# Altium schematic symbol library AD_Lib.SchLib: 1239 symbols (part 2 of 9)
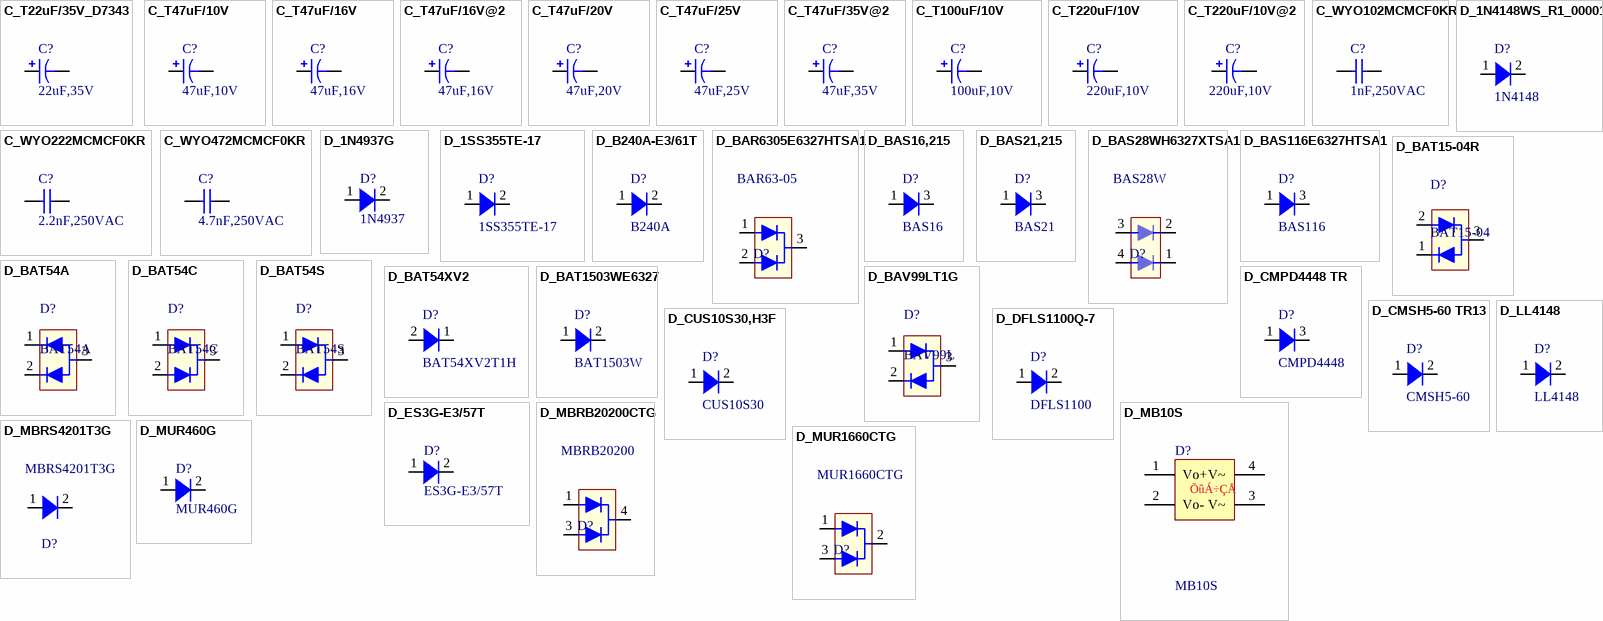
[diagram p43: symbols C_T22uF/35V_D7343 to D_MUR1660CTG]

## D_LL4148
designator D?, comment LL4148
¶þ¼«¹Ü,²£·â; Manufacturer: Fairchild; pro-environment: RoHS; Quality: -65~175¡æ; SN: 03.4.21.11.99414801S; Value: 0.2A,100V; other: Trr=4ns; PadsNum: 0; Category: ¶þ¼«¹Ü; OPN: LL4148; Part: LL4148; QTY: 2500; Price: 0.117; OPN_JLC: OPN_JLC; SN_JLC: SN_JLC; Price_JLC: 0
footprint SOD80 (Metal Electrode Face (MELF) Diode; Body 3.5 x 1.6 mm (LxDia))
pins: 1 A, 2 K

## D_MB10S
designator D?, comment MB10S
ÕûÁ÷ÇÅ;0.5A/1000V; Manufacturer: ON; Quality: -40~150¡æ; Value: 5V/0.2A; pro-environment: RoHS; PadsNum: 0; SN: SN; other: 0.5A/1000V; Category: Ä£¿éµçÂ·; OPN: MB10S; Part: MB10S; QTY: 3000; Price: 1.3688; OPN_JLC: OPN_JLC; SN_JLC: SN_JLC; Price_JLC: 0
footprint SOIC245P670X290-4N (SOIC-4, ÈçMB107S)
pins: 1 Vo+ (power), 2 Vo- (power), 3 V~ (power), 4 V~ (power)
text: ÕûÁ÷ÇÅ

## D_MBRB20200CTG
designator D?, comment MBRB20200
Ð¤ÌØ»ù¶þ¼«¹Ü; 20A; 200V; 1V; Manufacturer: ON; Quality: -65~150¡æ; Value: 20A,200V; pro-environment: RoHS; OPN: MBRB20200CTG; PadsNum: 0; SN: SN; Category: ¶þ¼«¹Ü; Part: MBRB20200; QTY: 50; Price: 9.9333; OPN_JLC: OPN_JLC; SN_JLC: C897026; Price_JLC: 0
footprint TO263-3 (D2-PAK, 4-Leads, Body 9.3x10.2mm, Pitch 2.54mm, Lead Span 15.2mm, IPC Low Density)
pins: 1, 3, 4

## D_MBRS4201T3G
designator D?, comment MBRS4201T3G
Ð¤ÌØ»ù¶þ¼«¹Ü; 4A; 200V; 0.8V; 35ns; Manufacturer: ON; Quality: -55~150¡æ; Value: 4A,200V; pro-environment: RoHS; other: Vf=0.8V;trr=35ns; PadsNum: 2; SN: SN; Category: ¶þ¼«¹Ü; OPN: MBRS4201T3G; Part: MBRS4201T3G; QTY: 2500; Price: 3.5802; OPN_JLC: OPN_JLC; SN_JLC: C145187; Price_JLC: 2.61
footprint SMC (DO-214-AB/SMC)
pins: 1 A, 2 K

## D_MUR460G
designator D?, comment MUR460G
¿ì»Ö¶þ¼«¹Ü;4A;600V; Manufacturer: ON; pro-environment: RoHS; Quality: -55~150¡æ; SN: 03.4.21.11.99460G01S; Value: 4A,600V; other: Vf=1.28V;trr=75ns; PadsNum: 0; Category: ¶þ¼«¹Ü; OPN: MUR460G; Part: MUR460G; QTY: 500; Price: 2.1294; OPN_JLC: OPN_JLC; SN_JLC: SN_JLC; Price_JLC: 0
footprint DO-201AD (Diode, Axial; Body 9.5 x 5.3 mm (LxDia. max), Lead Dia. 1.32 mm (max))
pins: 1 A, 2 K

## D_MUR1660CTG
designator D?, comment MUR1660CTG
¶þ¼«¹Ü; ³¬¿ì»Ö; 16A; 600V; Manufacturer: ON; Quality: -65~175¡æ; Value: 16A,600V; pro-environment: RoHS; SN: 03.4.21.11.31166001S; other: 16A;600V;60ns; PadsNum: 0; Category: ¶þ¼«¹Ü; OPN: MUR1660CTG; Part: MUR1660CTG; QTY: 50; Price: 6.5169; OPN_JLC: OPN_JLC; SN_JLC: SN_JLC; Price_JLC: 0
footprint TO220-3 (TO, Thru-Hole, Vertical, Heatsink Mounted; 3 In-Line Leads; Pitch 2.54 mm)
pins: 1, 2, 3

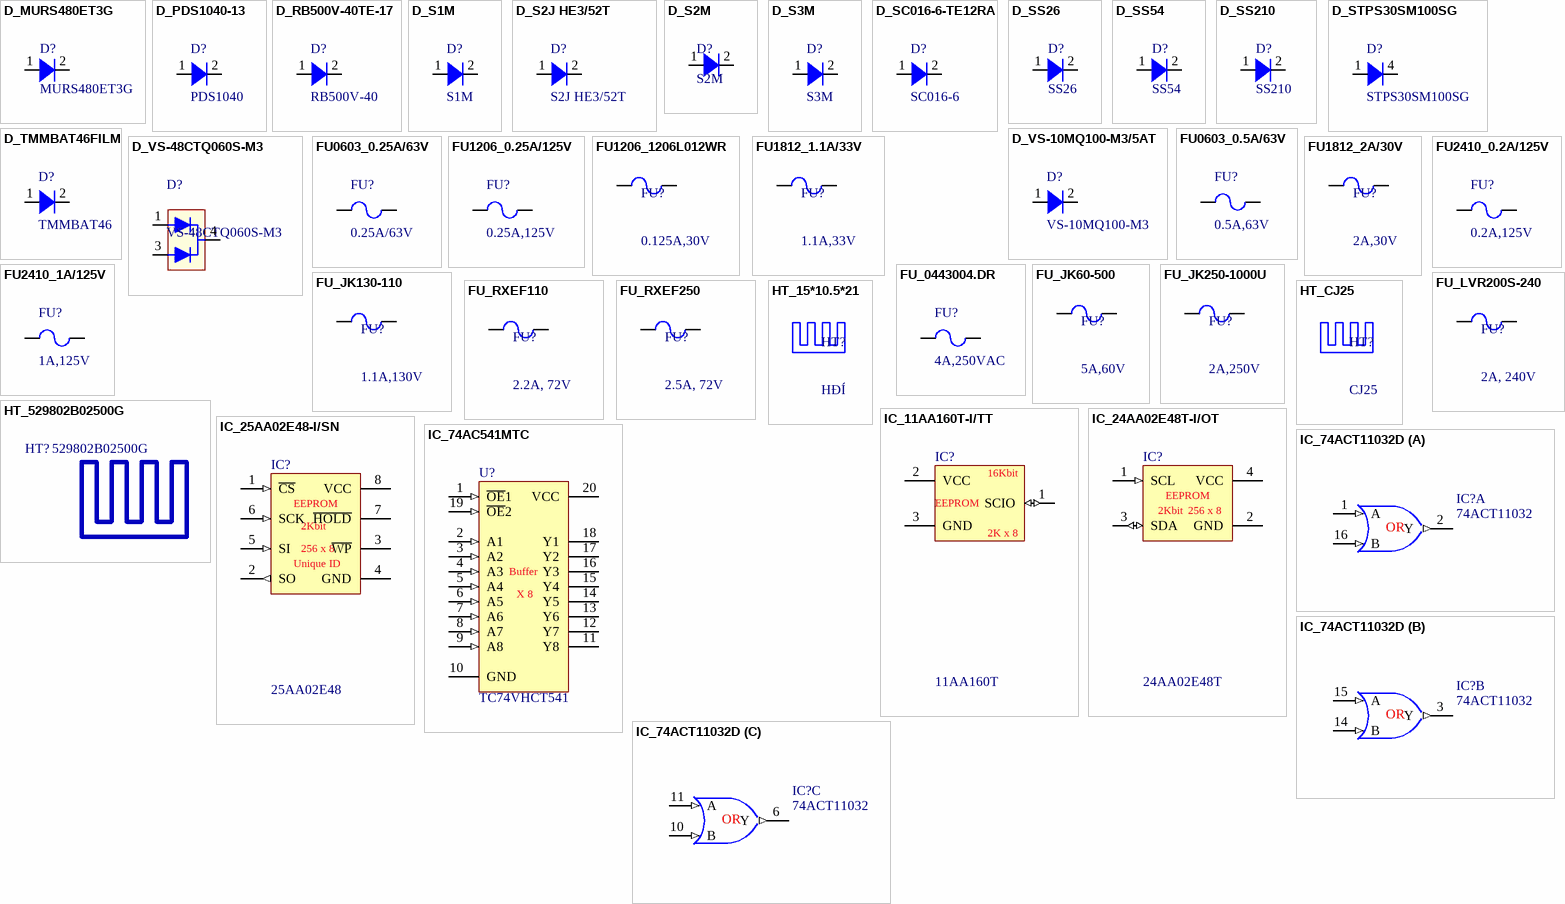
[diagram p5: symbols D_MURS480ET3G to IC_74ACT11032D]

## D_MURS480ET3G
designator D?, comment MURS480ET3G
Ð¤ÌØ»ù¶þ¼«¹Ü; 4A; 800V; .185V; 100ns; Manufacturer: ON; pro-environment: RoHS; Quality: -65~175¡æ; Value: 4A,800V; PadsNum: 2; SN: SN; Category: ¶þ¼«¹Ü; OPN: MURS480ET3G; Part: MURS480ET3G; QTY: 2500; Price: ?; OPN_JLC: MURS480ET3G; SN_JLC: C145513; Price_JLC: 4.72
footprint SMC (DO-214-AB/SMC)
pins: 1 A, 2 K

## D_PDS1040-13
designator D?, comment PDS1040
Ð¤ÌØ»ù¶þ¼«¹Ü;10A;40V; Manufacturer: Diodes; pro-environment: RoHS; Quality: -65~180¡æ; SN: 03.4.21.17.99PDS101S; Value: 10A,40V; OPN: PDS1040-13; other: MARK=S1040; PadsNum: 0; Category: ¶þ¼«¹Ü; Part: PDS1040; QTY: 5000; Price: 1.11618; Price: 3.4983; OPN_JLC: OPN_JLC; SN_JLC: SN_JLC; Price_JLC: 0
footprint POWERDI_5 (DIODEÖ®Ð¤ÍÑ»ù¶þ¼«¹Ü)
pins: 1 A, 2 K

## D_RB500V-40TE-17
designator D?, comment RB500V-40
Ð¤ÌØ»ù¶þ¼«¹Ü;0.1A;45V; Manufacturer: ROHM; pro-environment: RoHS; Quality: -55~150¡æ; Value: 0.1A,45V; OPN: RB500V-40TE-17; PadsNum: 0; SN: SN; Category: ¶þ¼«¹Ü; Part: RB500V-40; Price: ?; OPN_JLC: OPN_JLC; SN_JLC: SN_JLC; Price_JLC: 0
footprint SOD323 (SOD-323/SC-76; 2 Leads; Body 1.7 x 1.3 mm, (LxW))
pins: 1 A, 2 K

## D_S1M
designator D?, comment S1M
ÕûÁ÷¶þ¼«¹Ü;1A;1kV; Manufacturer: Fairchild; pro-environment: RoHS; Quality: -55~150¡æ; SN: 03.4.21.11.990S1M01S; Value: 1A,1000V; PadsNum: 0; Category: ¶þ¼«¹Ü; OPN: S1M; Part: S1M; QTY: 7500; Price: 0.3074; OPN_JLC: US1M; SN_JLC: C5441; Price_JLC: 0
footprint SMA (DO-214-AC/SMA)
pins: 1 A, 2 K

## D_S2J HE3/52T
designator D?, comment S2J HE3/52T
ÕûÁ÷¶þ¼«¹Ü;1.5A;600V; Manufacturer: Vishay; pro-environment: RoHS; Quality: -55~150¡æ; SN: 03.4.21.11.99S2JH01S; Value: 1.5A,600V; PadsNum: 0; Category: ¶þ¼«¹Ü; OPN: S2J HE3/52T; Part: S2J HE3/52T; QTY: 750; Price: ?; OPN_JLC: OPN_JLC; SN_JLC: SN_JLC; Price_JLC: 0
footprint SMB (DO-214-AA/SMB)
pins: 1 A, 2 K

## D_S2M
designator D?, comment S2M
ÕûÁ÷¶þ¼«¹Ü; 1.1V@2A; 1kV; Manufacturer: ON; pro-environment: RoHS; Quality: -65~150¡æ; Value: 2A,1kV; PadsNum: 2; Category: ¶þ¼«¹Ü; OPN: S2M; Part: S2M; QTY: 3000; SN: SN; Price: 0.6084; OPN_JLC: S2M; SN_JLC: C18905; Price_JLC: 0.118141
footprint SMB (DO-214-AA/SMB)
pins: 1 A, 2 K

## D_S3M
designator D?, comment S3M
ÕûÁ÷¶þ¼«¹Ü;3A;1kV; Manufacturer: Fairchild; pro-environment: RoHS; Quality: -55~150¡æ; SN: 03.4.21.11.990S3M01S; Value: 3A,1000V; PadsNum: 0; Category: ¶þ¼«¹Ü; OPN: S3M; Part: S3M; QTY: 3000; Price: 0.80847; OPN_JLC: OPN_JLC; SN_JLC: SN_JLC; Price_JLC: 0
footprint SMC (DO-214-AB/SMC)
pins: 1 A, 2 K

## D_SC016-6-TE12RA
designator D?, comment SC016-6
ÕûÁ÷¶þ¼«¹Ü;1A;600V; Manufacturer: Vishay; pro-environment: RoHS; Quality: -55~150¡æ; Value: 1A,600V; OPN: SC016-6-TE12RA; other: MARK=B6; PadsNum: 0; SN: SN; Category: ¶þ¼«¹Ü; Part: SC016-6; QTY: 750; Price: ?; OPN_JLC: OPN_JLC; SN_JLC: SN_JLC; Price_JLC: 0
footprint SMB (DO-214-AA/SMB)
pins: 1 A, 2 K

## D_SS26
designator D?, comment SS26
Ð¤ÌØ»ù¶þ¼«¹Ü; 2A; 60V; 0.7V@2A; Manufacturer: Fairchild; pro-environment: RoHS; Quality: -65~125¡æ; SN: 03.4.21.17.99SS2601S; Value: 2A,60V; PadsNum: 0; Category: ¶þ¼«¹Ü; OPN: SS26; Part: SS26; QTY: 3000; Price: 1.02726; OPN_JLC: OPN_JLC; SN_JLC: SN_JLC; Price_JLC: 0
footprint SMB (DO-214-AA/SMB)
pins: 1 A, 2 K

## D_SS54
designator D?, comment SS54
Ð¤ÌØ»ù¶þ¼«¹Ü;5A;40V; Manufacturer: LC Á¢´´; pro-environment: RoHS; Quality: -65~125¡æ; Value: 5A,40V; PadsNum: 0; SN: SN; Category: ¶þ¼«¹Ü; OPN: SS54; Part: SS54; QTY: 3000; Price: 0.304; OPN_JLC: SS54; SN_JLC: C22452; Price_JLC: 0
footprint SMA (DO-214-AC/SMA)
pins: 1 A, 2 K

## D_SS210
designator D?, comment SS210
Ð¤ÌØ»ù¶þ¼«¹Ü;2A;100V; Manufacturer: LC Á¢´´; pro-environment: RoHS; Quality: -65~125¡æ; Value: 2A,100V; PadsNum: 0; SN: SN; Category: ¶þ¼«¹Ü; OPN: SS210; Part: SS210; QTY: 3000; Price: 0.18; OPN_JLC: SS210; SN_JLC: C14996; Price_JLC: 0
footprint SMA (DO-214-AC/SMA)
pins: 1 A, 2 K

## D_STPS30SM100SG
designator D?, comment STPS30SM100SG
Ð¤ÌØ»ù¶þ¼«¹Ü;30A;100V; Manufacturer: ST; pro-environment: RoHS; Quality: -40~150¡æ; SN: 03.4.21.17.72S30S01S; Value: 30A,100V; PadsNum: 0; Category: ¶þ¼«¹Ü; OPN: STPS30SM100SG; Part: STPS30SM100SG; QTY: 10000; other: 30A;100V; Price: 9.594; OPN_JLC: OPN_JLC; SN_JLC: SN_JLC; Price_JLC: 0
footprint TO263-3 (D2-PAK, 4-Leads, Body 9.3x10.2mm, Pitch 2.54mm, Lead Span 15.2mm, IPC Low Density)
pins: 1 A, 3 A, 4 K

## D_TMMBAT46FILM
designator D?, comment TMMBAT46
Ð¤ÌØ»ù¶þ¼«¹Ü;0.15A;100V; Manufacturer: ST; pro-environment: RoHS; Quality: -65~150¡æ; SN: 03.4.37.11.99D10701S; Value: 0.15A,100V; OPN: TMMBAT46FILM; PadsNum: 0; Category: ¶þ¼«¹Ü; Part: TMMBAT46; QTY: 2500; other: 0.15A,100V; Price: 0.94302; OPN_JLC: OPN_JLC; SN_JLC: SN_JLC; Price_JLC: 0
footprint Mini MELF (Footprint not found)
pins: 1 A, 2 K

## D_VS-10MQ100-M3/5AT
designator D?, comment VS-10MQ100-M3
Ð¤ÌØ»ù¶þ¼«¹Ü;1A;100V; 0.78V@1A; Manufacturer: Vishay; pro-environment: RoHS; Quality: -55~170¡æ; SN: 03.4.21.17.9910MQ01S; Value: 1A,100V; OPN: VS-10MQ100-M3/5AT; other: MARK=F09; PadsNum: 0; Category: ¶þ¼«¹Ü; Part: VS-10MQ100-M3; QTY: 7500; Price: 0.60021; OPN_JLC: OPN_JLC; SN_JLC: SN_JLC; Price_JLC: 0
footprint SMA (DO-214-AC/SMA)
pins: 1 A, 2 K

## D_VS-48CTQ060S-M3
designator D?, comment VS-48CTQ060S-M3
Ð¤ÌØ»ù¶þ¼«¹Ü;40A;60V; Manufacturer: Vishay; pro-environment: RoHS; Quality: -55~150¡æ; SN: 03.4.21.14.5148CT02S; Value: 40A,60V; PadsNum: 0; Category: ¶þ¼«¹Ü; OPN: VS-48CTQ060S-M3; Part: VS-48CTQ060S-M3; QTY: 50; other: 40A,60V; Price: 14.2623; OPN_JLC: OPN_JLC; SN_JLC: SN_JLC; Price_JLC: 0
footprint TO263-3 (D2-PAK, 4-Leads, Body 9.3x10.2mm, Pitch 2.54mm, Lead Span 15.2mm, IPC Low Density)
pins: 1, 3, 4

## FU0603_0.5A/63V
designator FU?, comment 0.5A,63V
Ò»´ÎÐÔ; 0.5A/63V; Manufacturer: Littelfuse; pro-environment: RoHS; Quality: -55~150¡æ; OPN: 0438.500WR; other: MARK=F; PadsNum: 2; SN: SN; Value: 0.5A,63V; Category: ±£ÏÕË¿; Part: 0.5A; QTY: 3000; Price: ?; OPN_JLC: 0438.500WR; SN_JLC: C151114; Price_JLC: 0.283191
footprint FU0603 (ÌùÆ¬ÈÛË¿)
pins: 1, 2

## FU0603_0.25A/63V
designator FU?, comment 0.25A/63V
Ò»´ÎÐÔ; 0.25A/63V; Manufacturer: Littelfuse; Part: 0.25A; pro-environment: RoHS; Quality: -55~150¡æ; OPN: 0438.250WR; other: MARK=D; PadsNum: 2; SN: SN; Value: 0.25A/63V; Category: ±£ÏÕË¿; QTY: 3000; Price: ?; OPN_JLC: 0438.250WR; SN_JLC: C189641; Price_JLC: 0.43085
footprint FU0603 (ÌùÆ¬ÈÛË¿)
pins: 1, 2

## FU1206_0.25A/125V
designator FU?, comment 0.25A,125V
Ò»´ÎÐÔ; 0.25A/125V; Manufacturer: Littelfuse; pro-environment: RoHS; Quality: -55~150¡æ; OPN: 0437.250WR; other: MARK=D; PadsNum: 2; SN: SN; Value: 0.25A,125V; Category: ±£ÏÕË¿; Part: 0.25A; QTY: 3000; Price: ?; OPN_JLC: OPN_JLC; SN_JLC: C206951; Price_JLC: 0.698128
footprint FU1206 (¹«ÖÆ3216£»Ó¢ÖÆ1206£»)
pins: 1, 2

## FU1206_1206L012WR
designator FU?, comment 0.125A,30V
×Ô»Ö¸´; 0.125A/30V; 0.29A/200ms; Manufacturer: Littelfuse; Other: 0.125A;30V;0.29A;200ms; Quality: -40¡æ~85¡æ; pro-environment: RoHS; OPN: 1206L012WR; PadsNum: 2; Value: 0.125A,30V; SN: SN; QTY: 3000; part: 1206L012WR; Price: 1.5933; OPN_JLC: 1206L012WR; SN_JLC: C151160; Price_JLC: 0.458098; Category: ÈÛË¿
footprint FU1206 (¹«ÖÆ3216£»Ó¢ÖÆ1206£»)
pins: 1, 2

## FU1812_1.1A/33V
designator FU?, comment 1.1A,33V
×Ô»Ö¸´; 1.1A/33V; 2.2A/300ms; Manufacturer: ½ð¿Æ; part: 2.2A; Other: 1.1A; 33V; 2.2A; 300ms; Quality: -40¡æ~85¡æ; pro-environment: RoHS; PadsNum: 2; Value: 1.1A,33V; SN: SN; QTY: 2000; OPN: -; Price: -; OPN_JLC: JK-mSMD110-33; SN_JLC: C369173; Price_JLC: 0.448346; Category: ÈÛË¿
footprint FU1812 (¹«ÖÆ4832£»Ó¢ÖÆ1812£»¹¦ÂÊ1/2W)
pins: 1, 2

## FU1812_2A/30V
designator FU?, comment 2A,30V
×Ô»Ö¸´; 2A/30V; 4A/2s; Manufacturer: °Ûºê; part: 2.2A; Other: 2A; 30V; 4A; 2s; Quality: -40¡æ~85¡æ; pro-environment: RoHS; PadsNum: 2; Value: 2A,30V; SN: SN; QTY: 1500; OPN: -; Price: -; OPN_JLC: BSMD1812-200-30V; SN_JLC: C960026; Price_JLC: 0.448346; Category: ÈÛË¿
footprint FU1812 (¹«ÖÆ4832£»Ó¢ÖÆ1812£»¹¦ÂÊ1/2W)
pins: 1, 2

## FU2410_0.2A/125V
designator FU?, comment 0.2A,125V
Ò»´ÎÐÔ; 0.2A/125V; Manufacturer: Littelfuse; pro-environment: RoHS; Quality: -55~125¡æ; OPN: 0448.200MR; PadsNum: 2; SN: SN; Value: 0.2A,125V; Category: ±£ÏÕË¿; Part: 0.2A; QTY: 1000; Price: ?; OPN_JLC: OPN_JLC; SN_JLC: SN_JLC; Price_JLC: 0
footprint FU2410 (LittleFuse, 0448 series)
pins: 1, 2

## FU2410_1A/125V
designator FU?, comment 1A,125V
Ò»´ÎÐÔ; 1A/125V; Manufacturer: Littelfuse; pro-environment: RoHS; Quality: -55~125¡æ; SN: 03.4.39.11.99045201S; OPN: 0452001.MRL; PadsNum: 0; Value: 1A,125V; Category: ±£ÏÕË¿; Part: 0452001.MRL; QTY: 1000; Price: ?; OPN_JLC: OPN_JLC; SN_JLC: SN_JLC; Price_JLC: 0
footprint FU2410 (LittleFuse, 0448 series)
pins: 1, 2

## FU_0443004.DR
designator FU?, comment 4A,250VAC
Ò»´ÎÐÔ; 4A/250VAC, 16m¦¸; Manufacturer: Littelfuse; pro-environment: RoHS; Quality: -55~125¡æ; OPN: 0443004.DR; PadsNum: 2; SN: SN; Value: 4A,250VAC; Category: ÈÛË¿; Part: 0443004.DR; QTY: 1500; Price: ?; OPN_JLC: OPN_JLC; SN_JLC: C187540; Price_JLC: 2.9
footprint FU_443 (LittleFuse, 443 series)
pins: 1, 2

## FU_JK60-500
designator FU?, comment 5A,60V
×Ô»Ö¸´; 5A/60V; 10A; Manufacturer: ½ð¿Æ; part: JK60-500; Quality: -40¡æ~85¡æ; pro-environment: RoHS; PadsNum: 0; Other: 5A/60V; 10A; Value: 5A,60V; SN: SN; QTY: 200; OPN: -; Price: -; OPN_JLC: JK60-500; SN_JLC: C369097; Price_JLC: 0.8112; Category: ÈÛË¿
footprint FU_JK60-500 (Footprint not found)
pins: 1, 2

## FU_JK130-110
designator FU?, comment 1.1A,130V
×Ô»Ö¸´; 1.1A/130V; 2.2A; Manufacturer: ½ð¿Æ; part: JK130-110; Quality: -40¡æ~85¡æ; pro-environment: RoHS; SN: 03.4.38.14.99F11001S; PadsNum: 0; Other: 1.1A/130V; 2.2A; Value: 1.1A,130V; QTY: 500; OPN: -; Price: -; OPN_JLC: JK130-110; SN_JLC: C968442; Price_JLC: 0.460559; Category: ÈÛË¿
footprint FU_JK130-110 (½ð¿ÆÖ®PPTC£¬JK130-110)
pins: 1, 2

## FU_JK250-1000U
designator FU?, comment 2A,250V
×Ô»Ö¸´; 1A/250V; 2A; Manufacturer: ½ð¿Æ; part: JK250-1000U; Other: 1A/2A, 250V; Quality: -40¡æ~85¡æ; pro-environment: RoHS; PadsNum: 0; Value: 2A,250V; SN: SN; QTY: 500; OPN: -; Price: -; OPN_JLC: JK250-1000U; SN_JLC: C369137; Price_JLC: 1.1765; Category: ÈÛË¿
footprint FU_JK250-1000U (½ð¿ÆJK250ÏµÁÐÖ®PTC£¬JK250-1000U)
pins: 1, 2

## FU_LVR200S-240
designator FU?, comment 2A, 240V
×Ô»Ö¸´; 2A/240V; 4A; Manufacturer: Littelfuse; part: LVR200S; Other: 2A;240V;10%;; Quality: -30¡æ~85¡æ; pro-environment: RoHS; SN: 03.4.39.11.99R20001S; OPN: LVR200S-240; PadsNum: 2; Value: 2A, 240V; QTY: 250; Price: -; OPN_JLC: OPN_JLC; SN_JLC: C1562345; Price_JLC: 7.5; Category: ÈÛË¿
footprint FU_LVR-L5 (TEÖ®LVRÏµÁÐPPTC)
pins: 1, 2

## FU_RXEF110
designator FU?, comment 2.2A, 72V
×Ô»Ö¸´; 1.1A/72V, 2.2A; Manufacturer: Murata; Other: 2.2A;72V;10%; Quality: -40¡æ~85¡æ; pro-environment: RoHS; SN: 03.4.38.14.99F11001S; OPN: RXEF110; PadsNum: 0; Value: 2.2A, 72V; QTY: 500; part: RXEF110; Price: -; OPN_JLC: C434722; SN_JLC: SN_JLC; Price_JLC: 0.9922; Category: ÈÛË¿
footprint RXEF110 (LittelFuseÖ®PTC£¬RXEF110)
pins: 1, 2

## FU_RXEF250
designator FU?, comment 2.5A, 72V
×Ô»Ö¸´; 2.5A/72V; 5A; Manufacturer: Littelfuse; Quality: -40¡æ~85¡æ; pro-environment: RoHS; SN: 03.4.38.14.99F11001S; OPN: RXEF250; PadsNum: 2; Other: 2.5A/72V; 5A; Value: 2.5A, 72V; QTY: 250; part: RXEF250; Price: 3.616; OPN_JLC: RF2691-000; SN_JLC: C207232; Price_JLC: 3.75; Category: ÈÛË¿
footprint FU_RXEF250 (LittelFuseÖ®PPTC£¬RXEF250)
pins: 1, 2

## HT_15*10.5*21
designator HT?, comment HÐÍ
É¢ÈÈÆ¬; HÐÍ; 15*10.5*21; Manufacturer: öÎË³´ï; Value: 15*10.5*21 HÐÍÉ¢ÈÈÆ¬; pro-environment: RoHS; PadsNum: 0; Quality: *; SN: SN; QTY: *; Part: HÐÍ; other: *; Price: *; OPN_JLC: 15*10.5*21 HÐÍ; SN_JLC: C4649; Price_JLC: 0.578535
footprint HT_15x10.5x21 (Footprint not found)
pins: 1 P1 hidden, 2 P2 hidden

## HT_529802B02500G
designator HT?, comment 529802B02500G
É¢ÈÈÆ¬,3.7; Manufacturer: Aavid Thermalloy; Value: ¦Èn=3.70; SN: 03.4.39.18.99529801S; Pro-environment: RoHS; PadsNum: 0; Category: É¢ÈÈÆ÷; OPN: 529802B02500G; Part: 529802B02500G; Price: ?; OPN_JLC: OPN_JLC; SN_JLC: SN_JLC; Price_JLC: 0
footprint 529802B02500G (É¢ÈÈÆ÷)

## HT_CJ25
designator HT?, comment CJ25
É¢ÈÈÆ¬; Manufacturer: Õò½­³¤ºç; OPN: µç×ÓÉ¢ÈÈÆ÷CJ25£¬º¸½ÓÒý½Å£¬ºÚÉ«; pro-environment: RoHS; PadsNum: 0; Quality: *; SN: SN; Value: *; QTY: *; Part: CJ25; other: *; Price: *; OPN_JLC: OPN_JLC; SN_JLC: SN_JLC; Price_JLC: 0
footprint HT_CJ25
pins: 1 P1 hidden, 2 P2 hidden

## IC_11AA160T-I/TT
designator IC?, comment 11AA160T
EEPROM; 16Kb; 1.8~5.5V; UNIO; Manufacturer: Microchip; pro-environment: RoHS; Quality: -40~85¡æ; Value: 16Kb,1.8~5.5V; OPN: 11AA160T-I/TT; other: EEPROM,16Kb,1.8~5.5V,UNIO; PadsNum: 3; SN: SN; Category: ¼¯³ÉÐ¾Æ¬; Part: 11AA160T; QTY: 3000; Price: ?; OPN_JLC: 11AA160T-I/TT; SN_JLC: C2060983; Price_JLC: 2.74
footprint SOT23-3 (SOT-23; 3 Leads; Body 3.0 x 2.5 mm, inc. leads (LxW max))
pins: 1 SCIO (io), 2 VCC (power), 3 GND (power)
text: 16Kbit; EEPROM; 2K x 8

## IC_24AA02E48T-I/OT
designator IC?, comment 24AA02E48T
EEPROM; 2Kb; 1.7~5.5V; I2C; EUI-48±êÊ¶·û; Manufacturer: Microchip; pro-environment: RoHS; Quality: -40~85¡æ; Value: 2Kb,1.7~5.5V; OPN: 24AA02E48T-I/OT; other: EEPROM,2Kb,1.7~5.5V,I2C; PadsNum: 5; SN: SN; Category: ¼¯³ÉÐ¾Æ¬; Part: 24AA02E48T; QTY: 3000; Price: 1.6731; OPN_JLC: 24AA02E48T-I/OT; SN_JLC: C38987; Price_JLC: 1.3277
footprint SOT23-5 (SOT23, 5-Leads, Body 2.9x1.6mm, Pitch 0.95mm, Lead Span 2.7mm, IPC Low Density)
pins: 1 SCL (in), 2 GND (power), 3 SDA (io), 4 VCC (power)
text: EEPROM; 2Kbit; 256 x 8

## IC_25AA02E48-I/SN
designator IC?, comment 25AA02E48
EEPROM; 2Kb; 1.8~5.5V; SPI; Manufacturer: Microchip; pro-environment: RoHS; Quality: -40~85¡æ; Value: 2Kb,1.8~5.5V; OPN: 25AA02E48-I/SN; other: EEPROM,2Kb,256x8,1.5~5.5V,SPI; PadsNum: 0; SN: SN; Category: ¼¯³ÉÐ¾Æ¬; Part: 25AA02E48; QTY: 100; Price: 3.0888; OPN_JLC: OPN_JLC; SN_JLC: SN_JLC; Price_JLC: 0
footprint SO-8 (SOIC, 8-Leads, Body 4.9x3.9mm, Pitch 1.27mm, IPC Low Density)
pins: 1 ~{CS} (in), 2 SO (out), 3 ~{WP}, 4 GND (power), 5 SI (in), 6 SCK (in), 7 ~{HOLD}, 8 VCC (power)
text: EEPROM; 2Kbit; 256 x 8; Unique ID

## IC_74AC541MTC
designator U?, comment TC74VHCT541
»º³åÆ÷;8bit; Manufacturer: Toshiba; pro-environment: RoHS; Quality: -40~85¡æ; Value: Buffer; OPN: TC74VHCT541AFT; PadsNum: 0; SN: SN; Category: ¼¯³ÉÐ¾Æ¬; Part: TC74VHCT541; Price: ?; OPN_JLC: OPN_JLC; SN_JLC: SN_JLC; Price_JLC: 0
footprint TSSOP-20 (Shrink Small Outline; 20 Leads; Body Width 4.4 mm; Pitch 0.65 mm)
pins: 1 ~{OE}1 (in), 2 A1 (in), 3 A2 (in), 4 A3 (in), 5 A4 (in), 6 A5 (in), 7 A6 (in), 8 A7 (in), 9 A8 (in), 10 GND (power), 11 Y8 (hiz), 12 Y7 (hiz), 13 Y6 (hiz), 14 Y5 (hiz), 15 Y4 (hiz), 16 Y3 (hiz), 17 Y2 (hiz), 18 Y1 (hiz), 19 ~{OE}2 (in), 20 VCC (power)
text: X 8

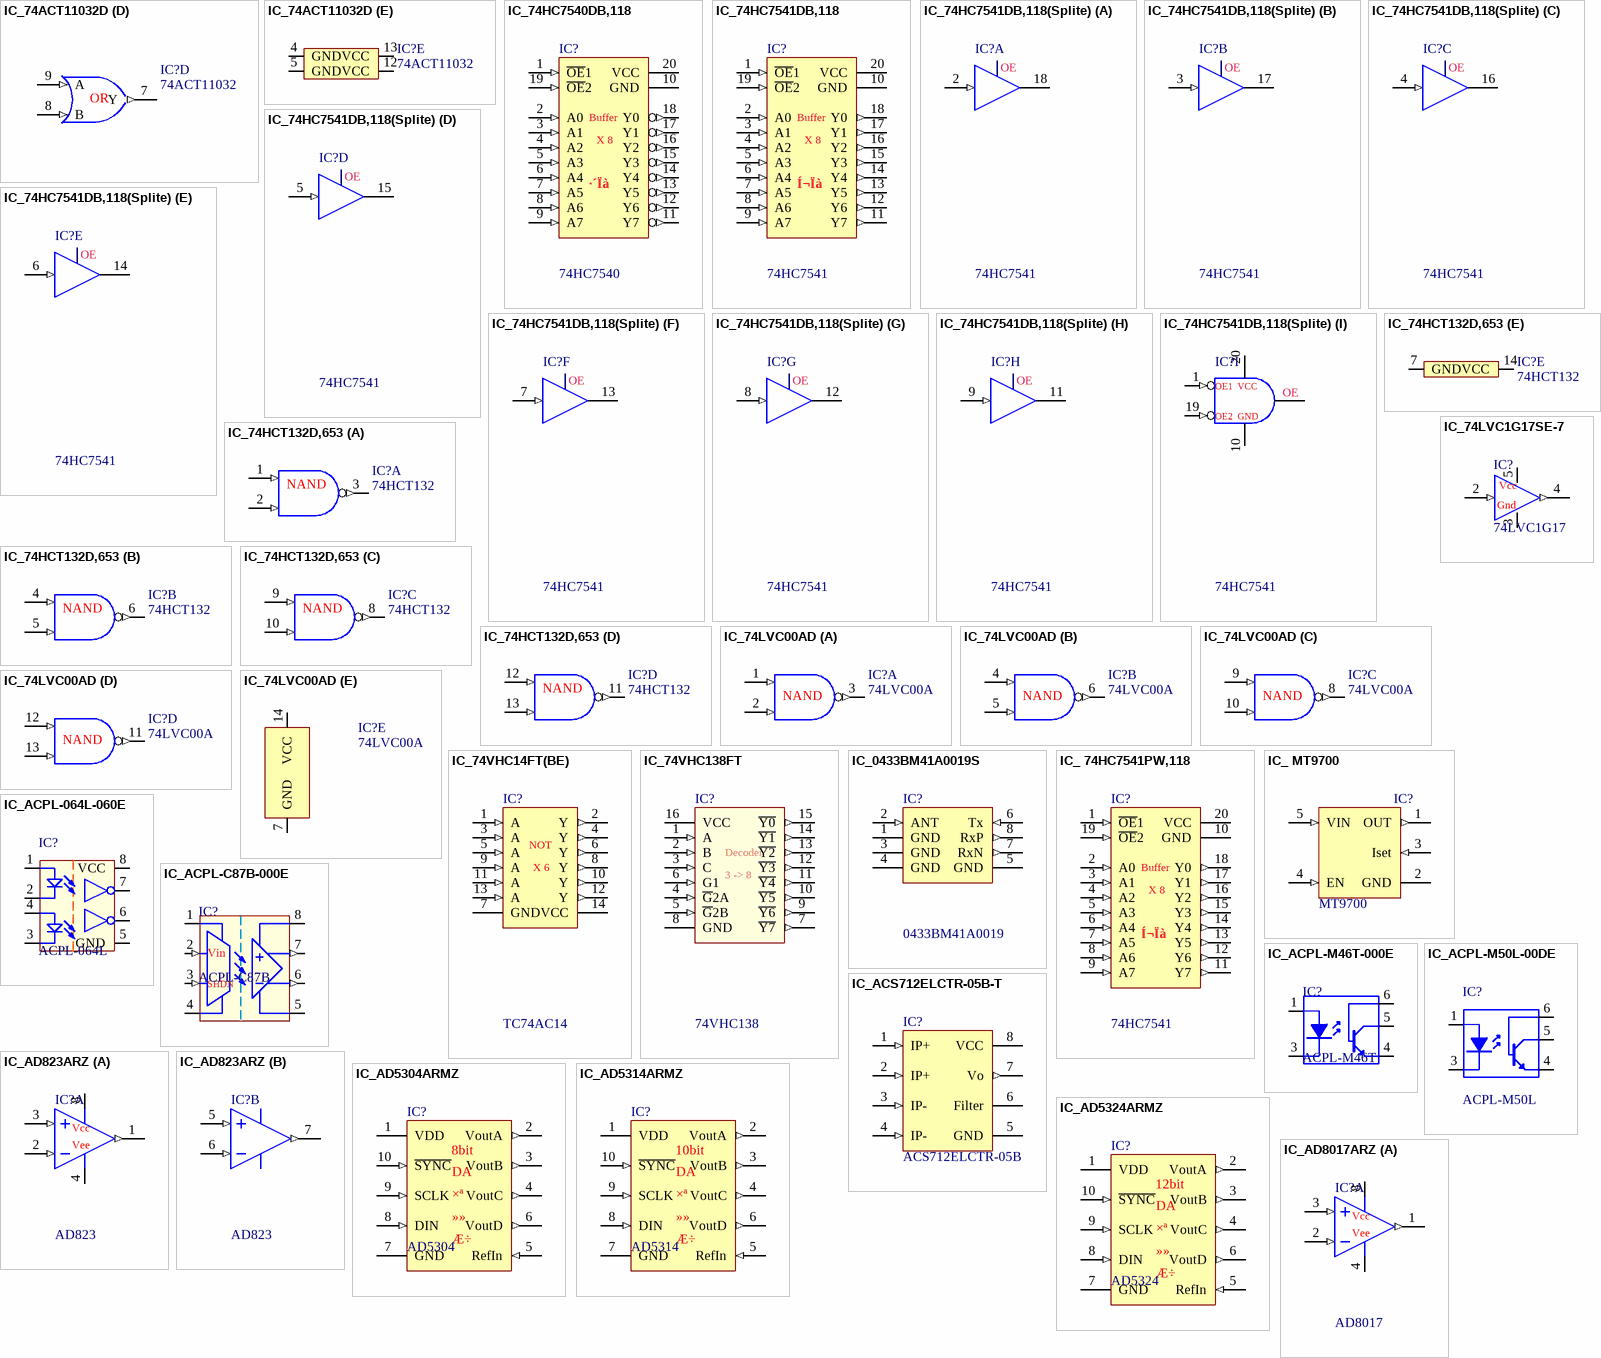
[diagram p6: symbols IC_74ACT11032D to IC_AD8017ARZ]

## IC_74ACT11032D
designator IC?, comment 74ACT11032
Âß¼­ÃÅ_»òÃÅ,4P,1.65~5.5V; Manufacturer: TI; pro-environment: RoHS; Quality: -40~85¡æ; SN: 03.4.11.18.84103201S; Other: 4Í¨µÀ2ÊäÈë»òÃÅ; Value: OR,4.5~5.5V; OPN: 74ACT11032D; PadsNum: 0; Category: ¼¯³ÉÐ¾Æ¬; Part: 74ACT11032; QTY: 40; Price: 19.188; OPN_JLC: OPN_JLC; SN_JLC: SN_JLC; Price_JLC: 0
footprint SOT353_M (SOT353, 5-Leads, Body 2x1.3mm, Pitch 0.65mm, Lead Span 2.1mm, IPC Low Density)
footprint SO-16 (16-Pin Small Outline Package 1.27 mm Pitch, IPC Low Density)
part A pins: 1 A (in), 2 Y (out), 16 B (in)
part B pins: 3 Y (out), 14 B (in), 15 A (in)
part C pins: 6 Y (out), 10 B (in), 11 A (in)
part D pins: 7 Y (out), 8 B (in), 9 A (in)
part E pins: 4 GND (power), 5 GND (power), 12 VCC (power), 13 VCC (power)
part A text: OR
part B text: OR
part C text: OR
part D text: OR

## IC_74HC7540DB,118
designator IC?, comment 74HC7540
»º³åÆ÷;8bit;Ê©ÃÜÌØÊäÈë;·´Ïà; Manufacturer: NXP; pro-environment: RoHS; Quality: -40~125¡æ; SN: 03.4.11.18.59754001S; Value: Buffer; OPN: 74HC7540DB,118; other: Vcc=2V~6V;8In8Out;·´Ïà; PadsNum: 0; Category: ¼¯³ÉÐ¾Æ¬; Part: 74HC7540; QTY: 1000; Price: ?; OPN_JLC: OPN_JLC; SN_JLC: SN_JLC; Price_JLC: 0
footprint SSOP-20_W5.3 (SOP, 20-Leads, Body 7.2x5.3mm, Pitch 0.65mm, IPC Low Density)
pins: 1 ~{OE}1 (in), 2 A0 (in), 3 A1 (in), 4 A2 (in), 5 A3 (in), 6 A4 (in), 7 A5 (in), 8 A6 (in), 9 A7 (in), 10 GND (power), 11 Y7 (out), 12 Y6 (out), 13 Y5 (out), 14 Y4 (out), 15 Y3 (out), 16 Y2 (out), 17 Y1 (out), 18 Y0 (out), 19 ~{OE}2 (in), 20 VCC (power)
text: X 8; ·´Ïà

## IC_74HC7541DB,118
designator IC?, comment 74HC7541
»º³åÆ÷;8bit;Ê©ÃÜÌØÊäÈë;Í¬Ïà; Manufacturer: NXP; pro-environment: RoHS; Quality: -40~125¡æ; SN: 03.4.11.18.59754101S; Value: Buffer; OPN: 74HC7541DB,118; other: Vcc=2V~6V;8In8Out;·Ç·´Ïà; PadsNum: 0; Category: ¼¯³ÉÐ¾Æ¬; Part: 74HC7541; QTY: 1000; Price: ?; OPN_JLC: OPN_JLC; SN_JLC: SN_JLC; Price_JLC: 0
footprint SSOP-20_W5.3 (SOP, 20-Leads, Body 7.2x5.3mm, Pitch 0.65mm, IPC Low Density)
pins: 1 ~{OE}1 (in), 2 A0 (in), 3 A1 (in), 4 A2 (in), 5 A3 (in), 6 A4 (in), 7 A5 (in), 8 A6 (in), 9 A7 (in), 10 GND (power), 11 Y7 (out), 12 Y6 (out), 13 Y5 (out), 14 Y4 (out), 15 Y3 (out), 16 Y2 (out), 17 Y1 (out), 18 Y0 (out), 19 ~{OE}2 (in), 20 VCC (power)
text: X 8; Í¬Ïà

## IC_74HC7541DB,118(Splite)
designator IC?, comment 74HC7541
»º³åÆ÷;8bit;Ê©ÃÜÌØÊäÈë;Í¬Ïà; Manufacturer: NXP; pro-environment: RoHS; Quality: -40~125¡æ; SN: 03.4.11.18.59754101S; Value: Buffer; OPN: 74HC7541DB,118; other: Vcc=2V~6V;8In8Out;·Ç·´Ïà; PadsNum: 0; Category: ¼¯³ÉÐ¾Æ¬; Part: 74HC7541; QTY: 1000; Price: 5.4054; OPN_JLC: OPN_JLC; SN_JLC: SN_JLC; Price_JLC: 0
footprint SSOP-20_W5.3 (SOP, 20-Leads, Body 7.2x5.3mm, Pitch 0.65mm, IPC Low Density)
part A pins: 2 A0 (in), 18 Y0 (hiz)
part B pins: 3 A1 (in), 17 Y1 (hiz)
part C pins: 4 A2 (in), 16 Y2 (hiz)
part D pins: 5 A3 (in), 15 Y3 (hiz)
part E pins: 6 A4 (in), 14 Y4 (hiz)
part F pins: 7 A5 (in), 13 Y5 (hiz)
part G pins: 8 A6 (in), 12 Y6 (hiz)
part H pins: 9 A7 (in), 11 Y7 (hiz)
part I pins: 1 ~{OE1} (in), 10 GND (power), 19 ~{OE2} (in), 20 VCC (power)
part A text: OE
part B text: OE
part C text: OE
part D text: OE
part E text: OE
part F text: OE
part G text: OE
part H text: OE
part I text: OE1; OE; OE2

## IC_74HCT132D,653
designator IC?, comment 74HCT132
Âß¼­ÃÅ_Óë·ÇÃÅ,4P,4.5~5.5V;Ê©ÃÜÌØÊäÈë; Manufacturer: TI; pro-environment: RoHS; Quality: -40~125¡æ; SN: 03.4.21.13.83T13201S; Other: 4Í¨µÀ2ÊäÈëÓë·ÇÃÅ,Ê©ÃÜÌØÊäÈë; Value: NAND,4.5~5.5V; OPN: 74HCT132D,653; PadsNum: 0; Category: ¼¯³ÉÐ¾Æ¬; Part: 74HCT132; QTY: 2500; Price: 0.92547; OPN_JLC: OPN_JLC; SN_JLC: SN_JLC; Price_JLC: 0
footprint SOT353_M (SOT353, 5-Leads, Body 2x1.3mm, Pitch 0.65mm, Lead Span 2.1mm, IPC Low Density)
footprint TSSOP-14 (TSOP, 14-Leads, Body 5x4.4mm, Pitch 0.65mm, IPC Low Density)
part A pins: 1 A (in), 2 B (in), 3 Y (out)
part B pins: 4 A (in), 5 B (in), 6 Y (out)
part C pins: 8 Y (out), 9 A (in), 10 B (in)
part D pins: 11 Y (out), 12 A (in), 13 B (in)
part E pins: 7 GND (power), 14 VCC (power)
part A text: NAND
part B text: NAND
part C text: NAND
part D text: NAND

## IC_74LVC00AD
designator IC?, comment 74LVC00A
Quad 2-input NAND gate; Manufacturer: Nexperia; pro-environment: RoHS; Quality: -40 ~ 85°C; Value: NAND, 1.2~5.5V; OPN: 74LVC00AD; PadsNum: 0; Category: Logic Gates; Part: 74LVC00A; Price_JLC: 0
footprint SO-14 (SOIC, 14-Leads, Body 8.7x3.9mm, Pitch 1.27mm, IPC Low Density)
part A pins: 1 A (in), 2 B (in), 3 Y (out)
part B pins: 4 A (in), 5 B (in), 6 Y (out)
part C pins: 8 Y (out), 9 A (in), 10 B (in)
part D pins: 11 Y (out), 12 A (in), 13 B (in)
part E pins: 7 GND (power), 14 VCC (power)
part A text: NAND
part B text: NAND
part C text: NAND
part D text: NAND

## IC_74LVC1G17SE-7
designator IC?, comment 74LVC1G17
µ¥»º³åÆ÷; ·Ç·´Ïà; 3.3V/5V; Manufacturer: Diodes; pro-environment: RoHS; Quality: -40~125¡æ; OPN: 74LVC1G17SE-7; Value: 1.65~5.5V; PadsNum: 5; SN: SN; part: 74LVC1G17; QTY: 3000; Price: 0.167506; OPN_JLC: 74LVC1G17SE-7; SN_JLC: C212314; Price_JLC: 0.167506
footprint SOT23-5 (SOT23, 5-Leads, Body 2.9x1.6mm, Pitch 0.95mm, Lead Span 2.7mm, IPC Low Density)
pins: 2 A (in), 3 GND (power), 4 ~{Y} (out), 5 VDD (power)
text: Vcc; Gnd

## IC_74VHC14FT(BE)
designator IC?, comment TC74AC14
Âß¼­ÃÅ_·ÇÃÅ,6P,2.0~5.5V; Manufacturer: Toshiba; pro-environment: RoHS; Quality: -55~150¡æ; Value: NOT,2.0~5.5V; OPN: 74VHC14FT(BE); PadsNum: 0; SN: SN; Category: ¼¯³ÉÐ¾Æ¬; Part: TC74AC14; QTY: 2500; Price: 0.66339; OPN_JLC: OPN_JLC; SN_JLC: SN_JLC; Price_JLC: 0
footprint TSSOP-14 (Shrink Small Outline; 14 Leads; Body Width 4.4 mm; Pitch 0.65 mm)
pins: 1 A (in), 2 Y (out), 3 A (in), 4 Y (out), 5 A (in), 6 Y (out), 7 GND (power), 8 Y (out), 9 A (in), 10 Y (out), 11 A (in), 12 Y (out), 13 A (in), 14 VCC (power)
text: NOT; X 6

## IC_74VHC138FT
designator IC?, comment 74VHC138
3-8ÒëÂëÆ÷,2.0V~5.5V; Manufacturer: Toshiba; pro-environment: RoHS; Quality: -40~85¡æ; SN: 03.4.11.18.47C13801S; OPN: 74VHC138FT; PadsNum: 0; Value: 2.0V~5.5V; Category: ¼¯³ÉÐ¾Æ¬; Part: 74VHC138; QTY: 2500; Price: 0.75231; OPN_JLC: OPN_JLC; SN_JLC: SN_JLC; Price_JLC: 0
footprint TSSOP-16 (TSOP, 16-Leads, Body 5x4.4mm, Pitch 0.65mm, IPC Low Density)
pins: 1 A (in), 2 B (in), 3 C (in), 4 ~{G}2A (in), 5 ~{G}2B (in), 6 G1 (in), 7 ~{Y7} (out), 8 GND (power), 9 ~{Y6} (out), 10 ~{Y5} (out), 11 ~{Y4} (out), 12 ~{Y3} (out), 13 ~{Y2} (out), 14 ~{Y1} (out), 15 ~{Y0} (out), 16 VCC (power)
text: Decoder; 3 -> 8

## IC_0433BM41A0019S
designator IC?, comment 0433BM41A0019
Baluns; 50¦¸; 424 MHz ~ 444 MHz;; Manufacturer: Johanson; Quality: -40~85¡æ; pro-environment: RoHS; OPN: 0433BM41A0019S; PadsNum: 0; Value: Baluns; 50¦¸; 424 MHz ~ 444 MHz;; SN: SN; Category: ¼¯³ÉÐ¾Æ¬; Part: 0433BM41A0019; QTY: 2000; Price: 3.276; OPN_JLC: OPN_JLC; SN_JLC: SN_JLC; Price_JLC: 0
footprint 0433BM41A0019 (Footprint not found)
pins: 1 GND (power), 2 ANT (in), 3 GND (power), 4 GND (power), 5 GND (power), 6 Tx (in), 7 RxN (out), 8 RxP (out)

## IC_ 74HC7541PW,118
designator IC?, comment 74HC7541
»º³åÆ÷;8bit;Ê©ÃÜÌØÊäÈë;Í¬Ïà; Manufacturer: NXP; pro-environment: RoHS; Quality: -40~125¡æ; SN: 03.4.11.18.75754101S; Value: Buffer; OPN: 74HC7541PW,118; other: Vcc=2V~6V;8In8Out;·Ç·´Ïà; PadsNum: 0; Category: ¼¯³ÉÐ¾Æ¬; Part: 74HC7541; QTY: 1000; Price: ?; OPN_JLC: OPN_JLC; SN_JLC: SN_JLC; Price_JLC: 0
footprint TSSOP-20 (Shrink Small Outline; 20 Leads; Body Width 4.4 mm; Pitch 0.65 mm)
pins: 1 ~{OE}1 (in), 2 A0 (in), 3 A1 (in), 4 A2 (in), 5 A3 (in), 6 A4 (in), 7 A5 (in), 8 A6 (in), 9 A7 (in), 10 GND (power), 11 Y7 (out), 12 Y6 (out), 13 Y5 (out), 14 Y4 (out), 15 Y3 (out), 16 Y2 (out), 17 Y1 (out), 18 Y0 (out), 19 ~{OE}2 (in), 20 VCC (power)
text: X 8; Í¬Ïà

## IC_ MT9700
designator IC?, comment MT9700
Åäµç¿ª¹Ø; 5.5V; 2A; Manufacturer: AEROSEMI; Value: 5.5V, 2A; Quality: -40~85¡æ; pro-environment: RoHS; PadsNum: 5; other: Åäµç¿ª¹Ø; SN: SN; Category: ¼¯³ÉÐ¾Æ¬; OPN: MT9700; Part: MT9700; QTY: 3000; Price: 0.556361; OPN_JLC: MT9700; SN_JLC: C89855; Price_JLC: 0.556361
footprint SOT23-5 (SOT23, 5-Leads, Body 2.9x1.6mm, Pitch 0.95mm, Lead Span 2.7mm, IPC Low Density)
pins: 1 OUT (out), 2 GND (power), 3 Iset (in), 4 EN (in), 5 VIN (in)

## IC_ACPL-064L-060E
designator IC?, comment ACPL-064L
¹âñî;10Mbps;1.6mA; Manufacturer: Avago; pro-environment: RoHS; Quality: -40~105¡æ; SN: 03.4.22.11.83064L01S; OPN: ACPL-064L-060E; other: If=1.6mA;VDD=3.3/5V; PadsNum: 0; Value: 10Mbps; Category: ¼¯³ÉÐ¾Æ¬; Part: ACPL-064L; QTY: 100; Price: ?; OPN_JLC: OPN_JLC; SN_JLC: SN_JLC; Price_JLC: 0
footprint SO-8 (SOIC, 8-Leads, Body 4.9x3.9mm, Pitch 1.27mm, IPC Low Density)
pins: 1 A1, 2 C1, 3 C2, 4 A2, 5 GND (power), 6 Vo2, 7 Vo1, 8 VCC (power)

## IC_ACPL-C87B-000E
designator IC?, comment ACPL-C87B
¸ôÀëÔË·Å, BW=100kHz; Manufacturer: ADI; pro-environment: RoHS; Quality: -40~105¡æ; SN: 03.4.23.21.83C87B01S; OPN: ACPL-C87B-000E; other: 4.5V~5.5V;Gain=1 V/V; PadsNum: 0; Value: BW=100kHz; Category: ¼¯³ÉÐ¾Æ¬; Part: ACPL-C87B; QTY: 1000; Price: 26.9568; OPN_JLC: OPN_JLC; SN_JLC: SN_JLC; Price_JLC: 0
footprint SSO-8 (¸ôÀëÔË·Å£¬ADI)
pins: 1 VDD1 (power), 2 Vin (in), 3 SHDN (in), 4 GND1 (power), 5 GND2 (power), 6 Vout- (out), 7 Vout+ (out), 8 VDD2

## IC_ACPL-M46T-000E
designator IC?, comment ACPL-M46T
¹âñî£¬¸ßËÙ£¬OCÊä³ö; Manufacturer: Avago; pro-environment: RoHS; Quality: -40~120¡æ; Value: 1MBd; OPN: ACPL-M46T-000E; other: OCÊä³ö; PadsNum: 0; SN: SN; Category: ¼¯³ÉÐ¾Æ¬; Part: ACPL-M46T; QTY: 100; Price: 28.4193; OPN_JLC: OPN_JLC; SN_JLC: SN_JLC; Price_JLC: 0
footprint SO-6 (SOT-23/SC-74A; 5 Leads; Body 3 x 3 mm, inc. leads (LxW max))
pins: 1 A "Anode", 3 K "Cathode", 4 E "Emitter", 5 C "Collector", 6 B "Collector"

## IC_ACPL-M50L-00DE
designator IC?, comment ACPL-M50L
¹âñî;10Mbps;1.6mA; Manufacturer: Avago; pro-environment: RoHS; Quality: -40~105¡æ; OPN: ACPL-M50L-00DE; other: If=1.6mA;VDD=3.3/5V; PadsNum: 0; SN: SN; Value: 10Mbps; Category: ¼¯³ÉÐ¾Æ¬; Part: ACPL-M50L; QTY: 100; Price: ?; OPN_JLC: OPN_JLC; SN_JLC: SN_JLC; Price_JLC: 0
footprint SO-6 (SOT-23/SC-74A; 5 Leads; Body 3 x 3 mm, inc. leads (LxW max))
pins: 1 A "Anode", 3 K "Cathode", 4 GND (power) "Emitter", 5 Vo (oc) "Collector", 6 VCC (power) "Power"

## IC_ACS712ELCTR-05B-T
designator IC?, comment ACS712ELCTR-05B
µçÁ÷´«¸ÐÆ÷; -5~5A; 5V; Manufacturer: Allegro MicroSystems; Quality: -40~125¡æ; Value: 5A,5V; pro-environment: RoHS; other: 185mV/A; OPN: ACS712ELCTR-05B-T; PadsNum: 0; SN: SN; Category: ¼¯³ÉÐ¾Æ¬; Part: ACS712ELCTR-05B; QTY: 3000; Price: 40.56; OPN_JLC: OPN_JLC; SN_JLC: SN_JLC; Price_JLC: 0
footprint SO-8 (SOIC, 8-Leads, Body 4.9x3.9mm, Pitch 1.27mm, IPC Low Density)
pins: 1 IP+ (in), 2 IP+ (in), 3 IP- (in), 4 IP- (in), 5 GND (power), 6 Filter, 7 Vo (out), 8 VCC (power)

## IC_AD823ARZ
designator IC?, comment AD823
OPA; 2P; Io=17mA; Manufacturer: ADI; Quality: -40~85¡æ; Value: ¡À1.5V~¡À18V;3V~36V;; pro-environment: RoHS; SN: 03.4.11.15.84AD8301S; other: Io=17mA;SR=25V/us; OPN: AD823ARZ; PadsNum: 0; Category: ¼¯³ÉÐ¾Æ¬; Part: AD823; QTY: 98; Price: ?; OPN_JLC: OPN_JLC; SN_JLC: SN_JLC; Price_JLC: 0
footprint SO-8 (SOIC, 8-Leads, Body 4.9x3.9mm, Pitch 1.27mm, IPC Low Density)
part A pins: 1 OUTA (out), 2 INA- (in), 3 INA+ (in), 4 VEE (power), 8 VCC (power)
part B pins: 5 INB+ (in), 6 INB- (in), 7 OUTB (out)
part A text: Vcc; Vee

## IC_AD5304ARMZ
designator IC?, comment AD5304
DA;SPI;4Í¨µÀ;143 kS/s;8bit; Manufacturer: Analog Devices; Quality: -40~105¡æ; Value: 167 kS/s;8bit; pro-environment: RoHS; other: 167 kS/s;8bit;2.5V~5.5V; OPN: AD5304ARMZ; PadsNum: 0; SN: SN; Category: ¼¯³ÉÐ¾Æ¬; Part: AD5304; QTY: 50; Price: 31.2388; OPN_JLC: OPN_JLC; SN_JLC: SN_JLC; Price_JLC: 0
footprint MSOP-10 (Body Width 3 mm; Pitch 0.5 mm;(uMAX-10&RM-10))
pins: 1 VDD (power), 2 VoutA (out), 3 VoutB (out), 4 VoutC (out), 5 RefIn (in), 6 VoutD (out), 7 GND (power), 8 DIN (in), 9 SCLK (in), 10 ~{SYNC} (in)
text: 8bit; DA; ×ª; »»; Æ÷

## IC_AD5314ARMZ
designator IC?, comment AD5314
DA;SPI;4Í¨µÀ;143 kS/s;10bit; Manufacturer: Analog Devices; Quality: -40~105¡æ; pro-environment: RoHS; other: 143 kS/s;10bit;2.5V~5.5V; OPN: AD5314ARMZ; PadsNum: 0; Value: 143 kS/s;10bit; SN: SN; Category: ¼¯³ÉÐ¾Æ¬; Part: AD5314; QTY: 50; Price: 40.7044; OPN_JLC: OPN_JLC; SN_JLC: SN_JLC; Price_JLC: 0
footprint MSOP-10 (Body Width 3 mm; Pitch 0.5 mm;(uMAX-10&RM-10))
pins: 1 VDD (power), 2 VoutA (out), 3 VoutB (out), 4 VoutC (out), 5 RefIn (in), 6 VoutD (out), 7 GND (power), 8 DIN (in), 9 SCLK (in), 10 ~{SYNC} (in)
text: 10bit; DA; ×ª; »»; Æ÷

## IC_AD5324ARMZ
designator IC?, comment AD5324
DA;SPI;4Í¨µÀ;125 kS/s;12bit;; Manufacturer: Analog Devices; Quality: -40~105¡æ; pro-environment: RoHS; SN: 03.4.11.17.83532401S; other: 125 kS/s;12bit;2.5V~5.5V; OPN: AD5324ARMZ; PadsNum: 0; Value: 125 kS/s;12bit; Category: ¼¯³ÉÐ¾Æ¬; Part: AD5324; QTY: 50; Price: 75.8872; OPN_JLC: OPN_JLC; SN_JLC: SN_JLC; Price_JLC: 0
footprint MSOP-10 (Body Width 3 mm; Pitch 0.5 mm;(uMAX-10&RM-10))
pins: 1 VDD (power), 2 VoutA (out), 3 VoutB (out), 4 VoutC (out), 5 RefIn (in), 6 VoutD (out), 7 GND (power), 8 DIN (in), 9 SCLK (in), 10 ~{SYNC} (in)
text: 12bit; DA; ×ª; »»; Æ÷

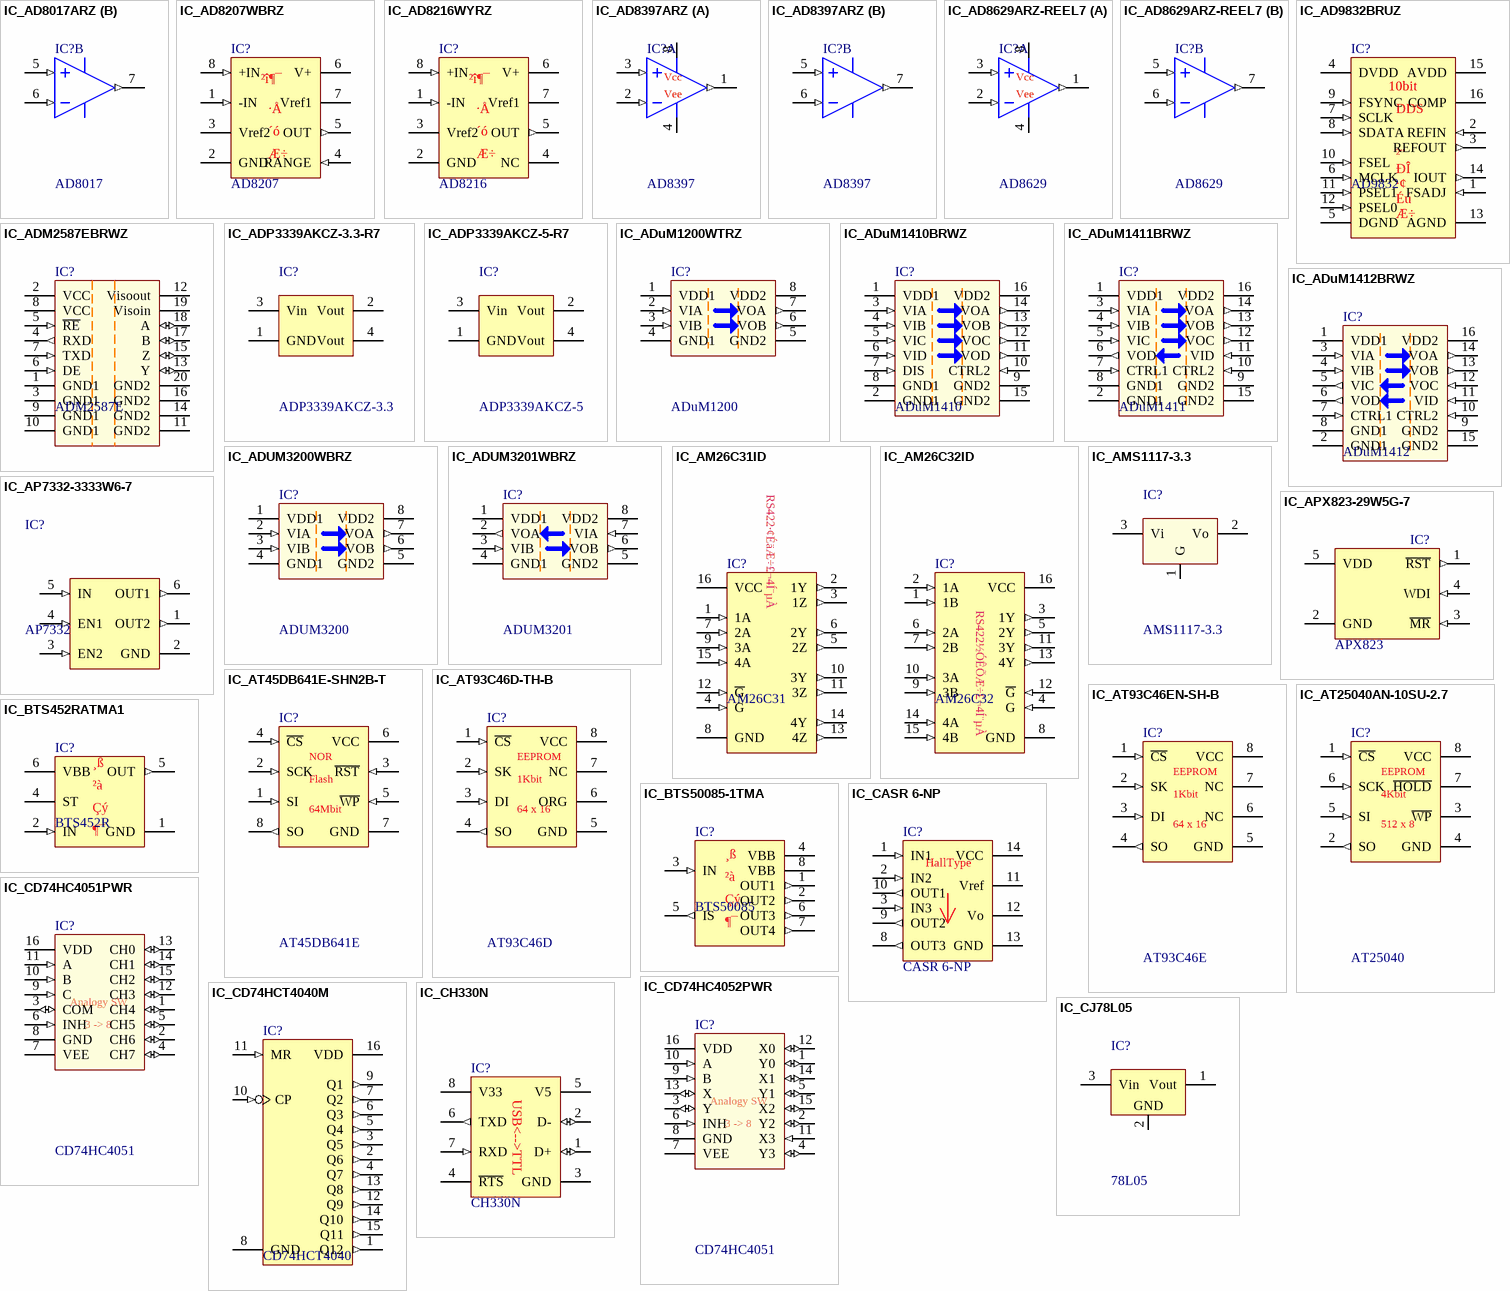
[diagram p7: symbols IC_AD8017ARZ to IC_CJ78L05]

## IC_AD8017ARZ
designator IC?, comment AD8017
OPA; 2P; Ë«µçÔ´; Io=0.27A; Manufacturer: ADI; Quality: -40~85¡æ; Value: ¡À2.5V~¡À6V; pro-environment: RoHS; SN: 03.4.11.15.82801701S; other: Io=270mA;SR=1.6kV/us; OPN: AD8017ARZ; PadsNum: 0; Category: ¼¯³ÉÐ¾Æ¬; Part: AD8017; QTY: 98; Price: ?; OPN_JLC: OPN_JLC; SN_JLC: SN_JLC; Price_JLC: 0
footprint SO-8 (SOIC, 8-Leads, Body 4.9x3.9mm, Pitch 1.27mm, IPC Low Density)
part A pins: 1 OUTA (out), 2 INA- (in), 3 INA+ (in), 4 VEE (power), 8 VCC (power)
part B pins: 5 INB+ (in), 6 INB- (in), 7 OUTB (out)
part A text: Vcc; Vee

## IC_AD8207WBRZ
designator IC?, comment AD8207
²î¶¯·Å´óÆ÷£¬-4V~65V£¬G=20; Manufacturer: Analog Devices; Quality: -40~125¡æ; Value: 3.3~5.5V; pro-environment: RoHS; other: G=20V/V;Vin=-4V~35/65V; OPN: AD8207WBRZ; PadsNum: 0; SN: SN; Category: ¼¯³ÉÐ¾Æ¬; Part: AD8207; Price: ?; OPN_JLC: OPN_JLC; SN_JLC: SN_JLC; Price_JLC: 0
footprint SO-8 (SOIC, 8-Leads, Body 4.9x3.9mm, Pitch 1.27mm, IPC Low Density)
pins: 1 -IN (in), 2 GND (power), 3 Vref2, 4 RANGE (in), 5 OUT (out), 6 V+ (power), 7 Vref1, 8 +IN (in)
text: ²î¶¯; ·Å; ´ó; Æ÷

## IC_AD8216WYRZ
designator IC?, comment AD8216
²î¶¯·Å´óÆ÷£¬-4V~65V£¬G=3; Manufacturer: Analog Devices; Quality: -40~125¡æ; Value: 4.5~5.5V; pro-environment: RoHS; SN: 03.4.11.17.82821601S; other: G=3V/V;Vin=-4V~65V; OPN: AD8216WYRZ; PadsNum: 0; Category: ¼¯³ÉÐ¾Æ¬; Part: AD8216; Price: ?; OPN_JLC: OPN_JLC; SN_JLC: SN_JLC; Price_JLC: 0
footprint SO-8 (SOIC, 8-Leads, Body 4.9x3.9mm, Pitch 1.27mm, IPC Low Density)
pins: 1 -IN (in), 2 GND (power), 3 Vref2, 4 NC, 5 OUT (out), 6 V+ (power), 7 Vref1, 8 +IN (in)
text: ²î¶¯; ·Å; ´ó; Æ÷
